# Altium footprint library 9-Pcblib_Con.PcbLib: 266 footprints (part 15 of 17)
Each footprint in its own frame and in the unit in brackets; x right, y up, seen from the top. Pads: shape width x height; smd on the part's side, far side on the other; paste and mask are expansions set on the pad; w line width, h text height; cw(c..) or ccw(c..) is an arc to the next point about the centre after c.
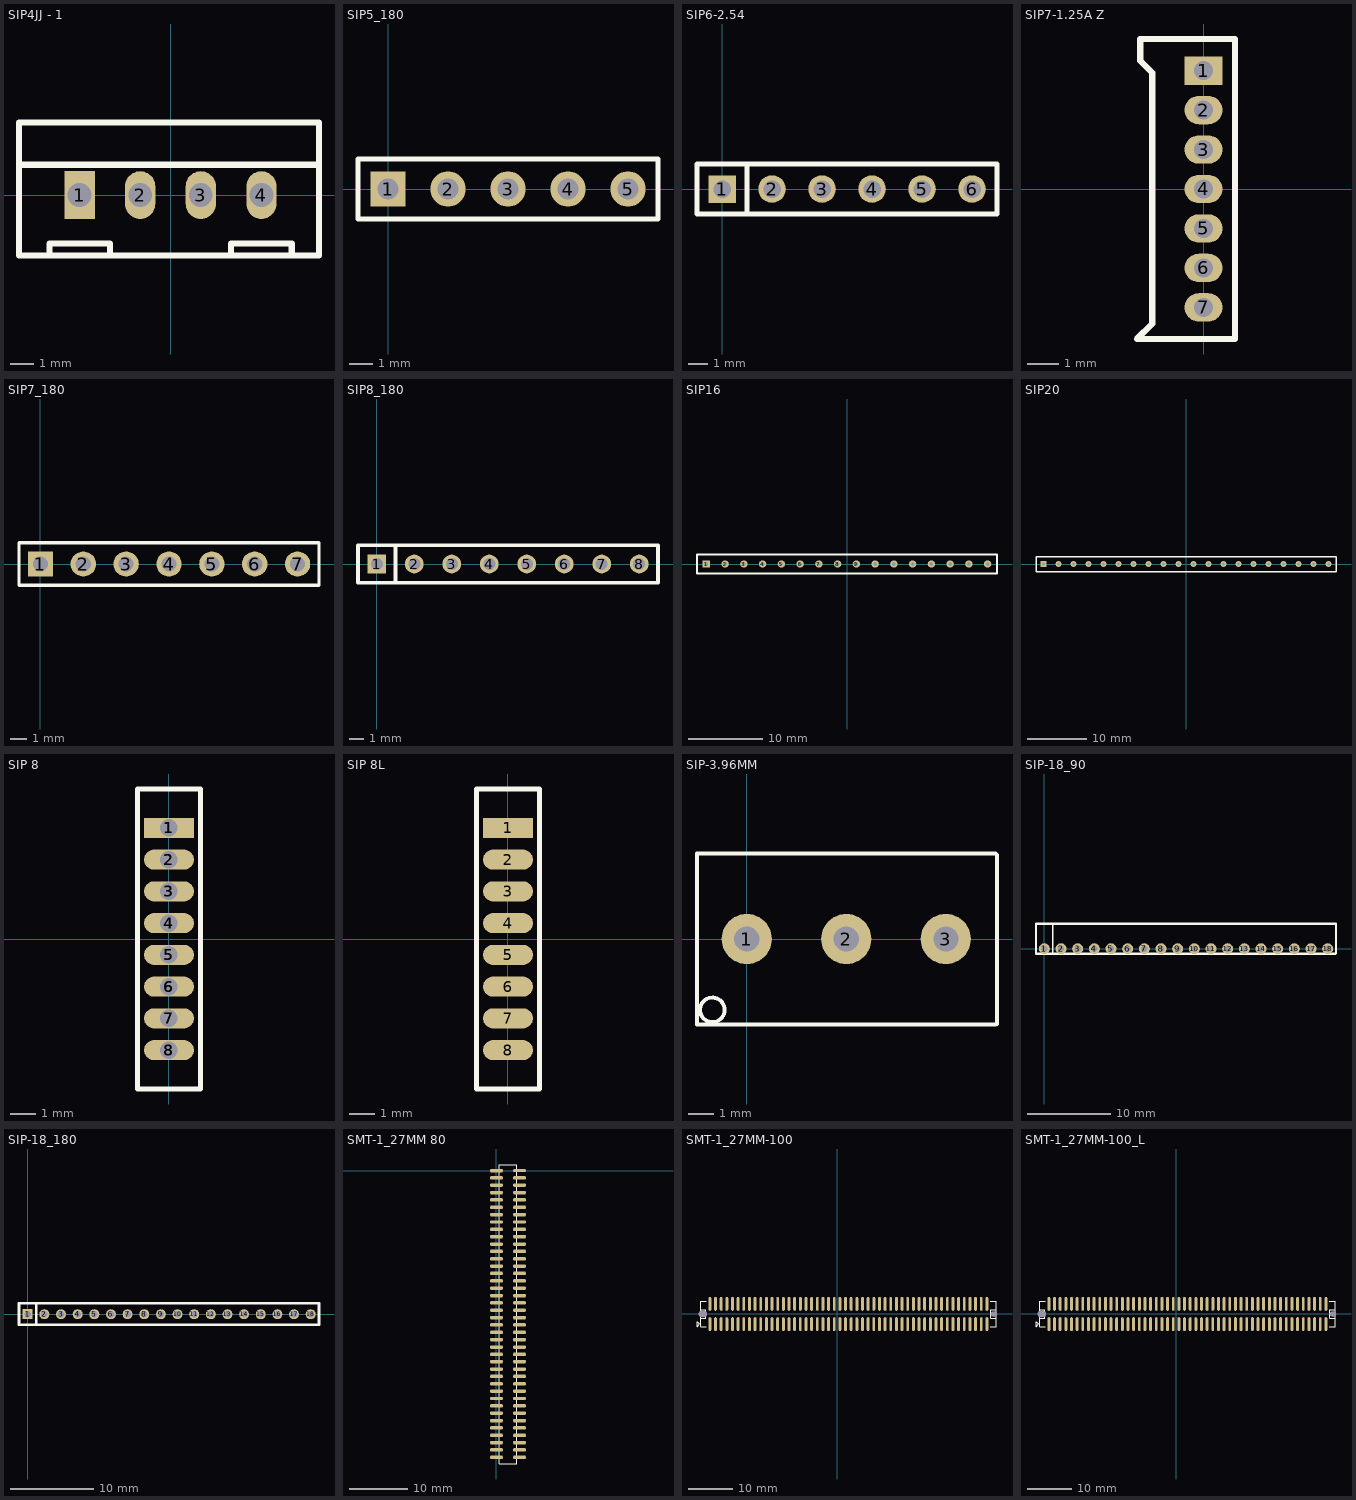
[diagram p14: the footprints below, top view; thin cyan lines are the x and y axes]

## SIP4JJ - 1 [mm]
pads (4):
  rect 1.27x2 hole 1: 1(-3.81,0)
  oval 1.27x2 hole 1: 2(-1.27,0) 3(1.27,0) 4(3.81,0)
Top Overlay:
  lines w0.254: -6.35,1.27 -5.08,1.27 2.54,1.27 3.81,1.27 6.096,1.27 ; -5.08,-2.54 -5.08,-2.032 -2.54,-2.032 -2.54,-2.54 ; -5.08,3.048 2.54,3.048 ; 2.54,-2.54 2.54,-2.032 5.08,-2.032 5.08,-2.54 ; -6.35,-2.54 6.223,-2.54 6.223,3.048 -6.35,3.048 -6.35,-2.54
3D body: height 7.1, standoff -2.9, extent -6.426,-2.574 6.274,3.226

## SIP5_180 [mm] "Connector; Heade"
height 0.508
pads (5):
  rect 1.5x1.5 hole 0.9: 1(0,0)
  round 1.5 hole 0.9: 2(2.54,0) 3(5.08,0) 4(7.62,0) 5(10.16,0)
Top Overlay:
  lines w0.2: -1.27,-1.27 11.43,-1.27 11.43,1.27 -1.27,1.27 -1.27,-1.27
3D body: height 8.54, standoff -3, extent -1.27,-1.27 11.43,1.27

## SIP6-2.54 [mil]
pads (6):
  rect 55x55 hole 35: 1(0,0)
  round 55 hole 35: 2(100,0) 3(200,0) 4(300,0) 5(400,0) 6(500,0)
Top Overlay:
  lines w10: 50,-50 50,50 ; -50,-50 550,-50 550,50 -50,50 -50,-50
3D body: height 344.09, standoff -110.24, extent -50,-50 550,48.03

## SIP7-1.25A Z [mm]
height 5.08
pads (7):
  rect 1.2x0.9 hole 0.6: 1(0,3.75)
  oval 1.2x0.9 hole 0.6: 2(0,2.5) 3(0,1.25) 4(0,0) 5(0,-1.25) 6(0,-2.5) 7(0,-3.75)
Top Overlay:
  lines w0.2: -2.108,-4.75 -1.626,-4.267 -1.626,3.683 -2,4.057 -2,4.75 1,4.75 1,-4.75 -2.108,-4.75

## SIP7_180 [mm] "Connector; Heade"
height 0.254
pads (7):
  rect 1.5x1.5 hole 0.9: 1(0,0)
  round 1.5 hole 0.9: 2(2.54,0) 3(5.08,0) 4(7.62,0) 5(10.16,0) 6(12.7,0) 7(15.24,0)
Top Overlay:
  lines w0.2: -1.27,-1.27 -1.27,1.27 16.51,1.27 16.51,-1.27 -1.27,-1.27
3D body: height 8.54, standoff -3, extent -1.27,-1.27 16.51,1.27

## SIP8_180 [mil]
pads (8):
  rect 50x50 hole 32: 1(0,0)
  round 50 hole 32: 2(100,0) 3(200,0) 4(300,0) 5(400,0) 6(500,0) 7(600,0) 8(700,0)
Top Overlay:
  lines w10: 50,-50 50,50 ; -50,-50 -50,50 750,50 750,-50 -50,-50
3D body: height 336.22, standoff -118.11, extent -49.99,-50 750.01,50

## SIP16 [mm]
pads (16):
  rect 1x1 hole 0.5: 1(-19.05,0)
  round 1 hole 0.5: 2(-16.51,0) 3(-13.97,0) 4(-11.43,0) 5(-8.89,0) 6(-6.35,0) 7(-3.81,0) 8(-1.27,0) 9(1.27,0) 10(3.81,0) 11(6.35,0) 12(8.89,0) 13(11.43,0) 14(13.97,0) 15(16.51,0) 16(19.05,0)
Top Overlay:
  lines w0.254: -20.32,-1.27 -20.32,1.27 20.32,1.27 20.32,-1.27 -20.32,-1.27

## SIP20 [mm]
pads (20):
  rect 1x1 hole 0.5: 1(-24.13,0)
  round 1 hole 0.5: 2(-21.59,0) 3(-19.05,0) 4(-16.51,0) 5(-13.97,0) 6(-11.43,0) 7(-8.89,0) 8(-6.35,0) 9(-3.81,0) 10(-1.27,0) 11(1.27,0) 12(3.81,0) 13(6.35,0) 14(8.89,0) 15(11.43,0) 16(13.97,0) 17(16.51,0) 18(19.05,0) 19(21.59,0) 20(24.13,0)
Top Overlay:
  lines w0.254: -25.4,-1.27 -25.4,1.27 25.4,1.27 25.4,-1.27 -25.4,-1.27

## SIP 8 [mm]
pads (16):
  round 0.8 hole 0.7: 1(0,4.445) 2(0,3.175) 3(0,1.905) 4(0,0.635) 5(0,-0.635) 6(0,-1.905) 7(0,-3.175) 8(0,-4.445)
  rect 2x0.8 smd: 1(0,4.445)
  oval 2x0.8 smd: 2(0,3.175) 3(0,1.905) 4(0,0.635) 5(0,-0.635) 6(0,-1.905) 7(0,-3.175) 8(0,-4.445)
Top Overlay:
  lines w0.2: -1.27,-6 1.27,-6 1.27,6 -1.27,6 -1.27,-6

## SIP 8L [mm]
pads (8):
  rect 2x0.8 smd: 1(0,4.445)
  oval 2x0.8 smd: 2(0,3.175) 3(0,1.905) 4(0,0.635) 5(0,-0.635) 6(0,-1.905) 7(0,-3.175) 8(0,-4.445)
Top Overlay:
  lines w0.2: -1.27,-6 1.27,-6 1.27,6 -1.27,6 -1.27,-6

## SIP-3.96MM [mm]
pads (3):
  round 2 hole 1: 1(0,0) 2(3.96,0) 3(7.92,0)
Top Overlay:
  circle w0.152: c-1.372,-2.819 r0.488
  lines w0.152: -1.981,3.378 -1.98,3.377 -1.98,-3.4 9.9,-3.4 ; -1.98,3.4 9.9,3.4 9.957,3.343 9.957,-3.378

## SIP-18_90 [mil]
pads (18):
  round 52 hole 30: 1(0,0) 2(78.74,0) 3(157.48,0) 4(236.22,0) 5(314.96,0) 6(393.7,0) 7(472.44,0) 8(551.18,0) 9(629.92,0) 10(708.66,0) 11(787.4,0) 12(866.14,0) 13(944.88,0) 14(1023.62,0) 15(1102.36,0) 16(1181.1,0) 17(1259.84,0) 18(1338.58,0)
Top Overlay:
  lines w7.87: 39.37,-24.5 39.37,117.5
  lines w10: -39.37,-23.62 1374.88,-23.62 1377.95,-20.55 1377.95,117.5 ; -39.37,-23.5 -39.37,117 ; -39.37,118.11 1377.95,118.11
Bottom Overlay:
  circle w5: c1338.32,1.69 r19.68
  circle w5: c1259.32,0.69 r19.68
  circle w5: c1183.32,-0.32 r19.68
  circle w5: c1103.32,0.69 r19.68
  circle w5: c1023.32,-1.31 r19.68
  circle w5: c946.32,-0.32 r19.68
  circle w5: c866.32,0.69 r19.68
  circle w5: c787.32,0.69 r19.68
  circle w5: c709.32,-0.32 r19.68
  circle w5: c628.32,1.69 r19.68
  circle w5: c550.32,1.69 r19.68
  circle w5: c470.32,0.69 r19.68
  circle w5: c394.32,-0.32 r19.68
  circle w5: c314.32,0.69 r19.68
  circle w5: c236.32,-1.31 r19.68
  circle w5: c159.32,-0.32 r19.68
  circle w5: c81.32,0.69 r19.68
  circle w5: c-1.68,-0.32 r19.68
3D body: height 82.68, standoff -106.3, extent -39,-7.22 1376.36,278.22

## SIP-18_180 [mm]
height 8.6
pads (18):
  rect 1.2x1.2 hole 0.8: 1(0,0)
  round 1.2 hole 0.8: 2(2,0) 3(4,0) 4(6,0) 5(8,0) 6(10,0) 7(12,0) 8(14,0) 9(16,0) 10(18,0) 11(20,0) 12(22,0) 13(24,0) 14(26,0) 15(28,0) 16(30,0) 17(32,0) 18(34,0)
Top Overlay:
  lines w0.305: 1.05,-1.24 1.05,1.3 ; -1.05,-1.243 35,-1.243 35,1.3 -1.05,1.3 -1.05,-1.243
3D body: height 4.5, standoff -2.95, extent -1,-1 35,1

## SMT-1_27MM 80 [mm]
height 1.2
pads (80):
  oct 2.3x0.6 smd: 1(0,0) 3(0,-1.245) 4(3.988,-1.245) 5(0,-2.515) 6(3.976,-2.515) 7(0,-3.785) 8(3.976,-3.785) 9(0,-5.055) 10(3.976,-5.055) 11(0,-6.325) 12(3.976,-6.325) 13(0,-7.595) 14(3.976,-7.595) 15(0,-8.865) 16(3.976,-8.865) 17(0,-10.135) 18(3.976,-10.135) 19(0,-11.405) 20(3.976,-11.405) 21(0,-12.675) 22(3.976,-12.675) 23(0,-13.945) 24(3.976,-13.945) 25(0,-15.215) 26(3.976,-15.215) 27(0,-16.485) 28(3.976,-16.485) 29(0,-17.755) 30(3.976,-17.755) 31(0,-19.025) 32(3.976,-19.025) 33(0,-20.295) 34(3.976,-20.295) 35(0,-21.565) 36(3.976,-21.565) 37(0,-22.835) 38(3.976,-22.835) 39(0,-24.105) 40(3.976,-24.105) 41(0,-25.375) 42(3.976,-25.375) 43(0,-26.645) 44(3.976,-26.645) 45(0,-27.915) 46(3.976,-27.915) 47(0,-29.185) 48(3.976,-29.185) 49(0,-30.455) 50(3.976,-30.455) 51(0,-31.725) 52(3.976,-31.725) 53(0,-32.995) 54(3.976,-32.995) 55(0,-34.265) 56(3.976,-34.265) 57(0,-35.535) 58(3.976,-35.535) 59(0,-36.805) 60(3.976,-36.805) 61(0,-38.075) 62(3.976,-38.075) 63(0,-39.345) 64(3.976,-39.345) 65(0,-40.615) 66(3.976,-40.615) 67(0,-41.885) 68(3.976,-41.885) 69(0,-43.155) 70(3.976,-43.155) 71(0,-44.425) 72(3.976,-44.425) 73(0,-45.695) 74(3.976,-45.695) 75(0,-46.965) 76(3.976,-46.965) 77(0,-48.235) 78(3.976,-48.235) 79(0,-49.505) 80(3.976,-49.505)
  oct 2.3x0.5 smd: 2(3.988,0)
Top Overlay:
  lines w0.025: 0.491,0.635 0.491,1.016
  lines w0.152: 0.491,0.991 0.491,-50.622 3.491,-50.622 3.491,0.991 ; 0.491,1.016 3.491,1.016
3D body: height 4.5, standoff 0, extent -0.486,-50.152 4.514,0.648

## SMT-1_27MM-100 [mm]
pads (102):
  round 0 hole 1.3 slot 1.8 at 0 deg unplated: 0(-30.147,-0.025)
  round 0 hole 0.9 slot 1.4 at 0 deg unplated: 0(35.233,-0.025)
  oval 0.65x3.1 smd: 1(-28.575,-2.3) 2(-28.572,2.25) 3(-27.305,-2.3) 4(-27.302,2.25) 5(-26.035,-2.3) 6(-26.032,2.25) 7(-24.765,-2.3) 8(-24.762,2.25) 9(-23.495,-2.3) 10(-23.492,2.25) 11(-22.225,-2.3) 12(-22.222,2.25) 13(-20.955,-2.3) 14(-20.952,2.25) 15(-19.685,-2.3) 16(-19.682,2.25) 17(-18.415,-2.3) 18(-18.412,2.25) 19(-17.145,-2.3) 20(-17.142,2.25) 21(-15.875,-2.3) 22(-15.872,2.25) 23(-14.605,-2.3) 24(-14.602,2.25) 25(-13.335,-2.3) 26(-13.332,2.25) 27(-12.065,-2.3) 28(-12.062,2.25) 29(-10.795,-2.3) 30(-10.792,2.25) 31(-9.525,-2.3) 32(-9.522,2.25) 33(-8.255,-2.3) 34(-8.252,2.25) 35(-6.985,-2.3) 36(-6.982,2.25) 37(-5.715,-2.3) 38(-5.712,2.25) 39(-4.445,-2.3) 40(-4.442,2.25) 41(-3.175,-2.3) 42(-3.172,2.25) 43(-1.905,-2.3) 44(-1.902,2.25) 45(-0.635,-2.3) 46(-0.632,2.25) 47(0.635,-2.3) 48(0.638,2.25) 49(1.905,-2.3) 50(1.908,2.25) 51(3.175,-2.3) 52(3.178,2.25) 53(4.445,-2.3) 54(4.448,2.25) 55(5.715,-2.3) 56(5.718,2.25) 57(6.985,-2.3) 58(6.988,2.25) 59(8.255,-2.3) 60(8.258,2.25) 61(9.525,-2.3) 62(9.528,2.25) 63(10.795,-2.3) 64(10.798,2.25) 65(12.065,-2.3) 66(12.068,2.25) 67(13.335,-2.3) 68(13.338,2.25) 69(14.605,-2.3) 70(14.608,2.25) 71(15.875,-2.3) 72(15.878,2.25) 73(17.145,-2.3) 74(17.148,2.25) 75(18.415,-2.3) 76(18.418,2.25) 77(19.685,-2.3) 78(19.688,2.25) 79(20.955,-2.3) 80(20.958,2.25) 81(22.225,-2.3) 82(22.228,2.25) 83(23.495,-2.3) 84(23.498,2.25) 85(24.765,-2.3) 86(24.768,2.25) 87(26.035,-2.3) 88(26.038,2.25) 89(27.305,-2.3) 90(27.308,2.25) 91(28.575,-2.3) 92(28.578,2.25) 93(29.845,-2.3) 94(29.848,2.25) 95(31.115,-2.3) 96(31.118,2.25) 97(32.385,-2.3) 98(32.388,2.25) 99(33.655,-2.3) 100(33.658,2.25)
Top Overlay:
  lines w0.2: -30.667,-1.025 -29.457,-1.025 -29.457,0.975 -30.667,0.975 ; -29.35,-2.925 -30.667,-2.925 -30.667,2.875 -29.35,2.875 ; 34.437,-2.925 35.753,-2.925 35.753,2.875 34.437,2.875 ; 35.753,-1.025 34.543,-1.025 34.543,0.975 35.753,0.975 ; -31.461,-2.854 -30.95,-2.342 -30.95,-2.225 -31.461,-1.714 -31.461,-2.854
Keep-Out Layer:
  lines w0: -30.397,-0.675 cw(c-30.397,-0.025) -30.397,0.625 -29.897,0.625 cw(c-29.897,-0.025) -29.897,-0.675 -30.397,-0.675 ; 34.983,-0.475 cw(c34.983,-0.025) 34.983,0.425 35.483,0.425 cw(c35.483,-0.025) 35.483,-0.475 34.983,-0.475
3D body: height 5.8, standoff -1.2, extent -30.836,-3.518 35.763,3.721

## SMT-1_27MM-100_L [mm]
pads (102):
  round 0 hole 1.3 slot 1.8 at 0 deg unplated: 0(-30.147,-0.025)
  round 0 hole 0.9 slot 1.4 at 0 deg unplated: 0(35.233,-0.025)
  oval 0.65x3.1 smd: 1(-28.575,-2.3) 2(-28.572,2.25) 3(-27.305,-2.3) 4(-27.302,2.25) 5(-26.035,-2.3) 6(-26.032,2.25) 7(-24.765,-2.3) 8(-24.762,2.25) 9(-23.495,-2.3) 10(-23.492,2.25) 11(-22.225,-2.3) 12(-22.222,2.25) 13(-20.955,-2.3) 14(-20.952,2.25) 15(-19.685,-2.3) 16(-19.682,2.25) 17(-18.415,-2.3) 18(-18.412,2.25) 19(-17.145,-2.3) 20(-17.142,2.25) 21(-15.875,-2.3) 22(-15.872,2.25) 23(-14.605,-2.3) 24(-14.602,2.25) 25(-13.335,-2.3) 26(-13.332,2.25) 27(-12.065,-2.3) 28(-12.062,2.25) 29(-10.795,-2.3) 30(-10.792,2.25) 31(-9.525,-2.3) 32(-9.522,2.25) 33(-8.255,-2.3) 34(-8.252,2.25) 35(-6.985,-2.3) 36(-6.982,2.25) 37(-5.715,-2.3) 38(-5.712,2.25) 39(-4.445,-2.3) 40(-4.442,2.25) 41(-3.175,-2.3) 42(-3.172,2.25) 43(-1.905,-2.3) 44(-1.902,2.25) 45(-0.635,-2.3) 46(-0.632,2.25) 47(0.635,-2.3) 48(0.638,2.25) 49(1.905,-2.3) 50(1.908,2.25) 51(3.175,-2.3) 52(3.178,2.25) 53(4.445,-2.3) 54(4.448,2.25) 55(5.715,-2.3) 56(5.718,2.25) 57(6.985,-2.3) 58(6.988,2.25) 59(8.255,-2.3) 60(8.258,2.25) 61(9.525,-2.3) 62(9.528,2.25) 63(10.795,-2.3) 64(10.798,2.25) 65(12.065,-2.3) 66(12.068,2.25) 67(13.335,-2.3) 68(13.338,2.25) 69(14.605,-2.3) 70(14.608,2.25) 71(15.875,-2.3) 72(15.878,2.25) 73(17.145,-2.3) 74(17.148,2.25) 75(18.415,-2.3) 76(18.418,2.25) 77(19.685,-2.3) 78(19.688,2.25) 79(20.955,-2.3) 80(20.958,2.25) 81(22.225,-2.3) 82(22.228,2.25) 83(23.495,-2.3) 84(23.498,2.25) 85(24.765,-2.3) 86(24.768,2.25) 87(26.035,-2.3) 88(26.038,2.25) 89(27.305,-2.3) 90(27.308,2.25) 91(28.575,-2.3) 92(28.578,2.25) 93(29.845,-2.3) 94(29.848,2.25) 95(31.115,-2.3) 96(31.118,2.25) 97(32.385,-2.3) 98(32.388,2.25) 99(33.655,-2.3) 100(33.658,2.25)
Top Overlay:
  lines w0.2: -30.667,-1.025 -29.457,-1.025 -29.457,0.975 -30.667,0.975 ; -29.35,-2.925 -30.667,-2.925 -30.667,2.875 -29.35,2.875 ; 34.437,-2.925 35.753,-2.925 35.753,2.875 34.437,2.875 ; 35.753,-1.025 34.543,-1.025 34.543,0.975 35.753,0.975 ; -31.461,-2.854 -31.461,-1.714 -30.95,-2.225 -30.95,-2.342 -31.461,-2.854
Keep-Out Layer:
  lines w0: -30.397,-0.675 cw(c-30.397,-0.025) -30.397,0.625 -29.897,0.625 cw(c-29.897,-0.025) -29.897,-0.675 -30.397,-0.675 ; 34.983,-0.475 cw(c34.983,-0.025) 34.983,0.425 35.483,0.425 cw(c35.483,-0.025) 35.483,-0.475 34.983,-0.475
3D body: height 5.8, standoff -1.2, extent -30.836,-3.518 35.763,3.721
3D body: height 15.18, standoff 5.63, extent -32.715,-3.404 37.31,42.622